# Altium footprint library SAMTEC SMD.PcbLib: 165 footprints (part 5 of 17)
Each footprint in its own frame and in the unit in brackets; x right, y up, seen from the top. Pads: shape width x height; smd on the part's side, far side on the other; paste and mask are expansions set on the pad; w line width, h text height; cw(c..) or ccw(c..) is an arc to the next point about the centre after c.
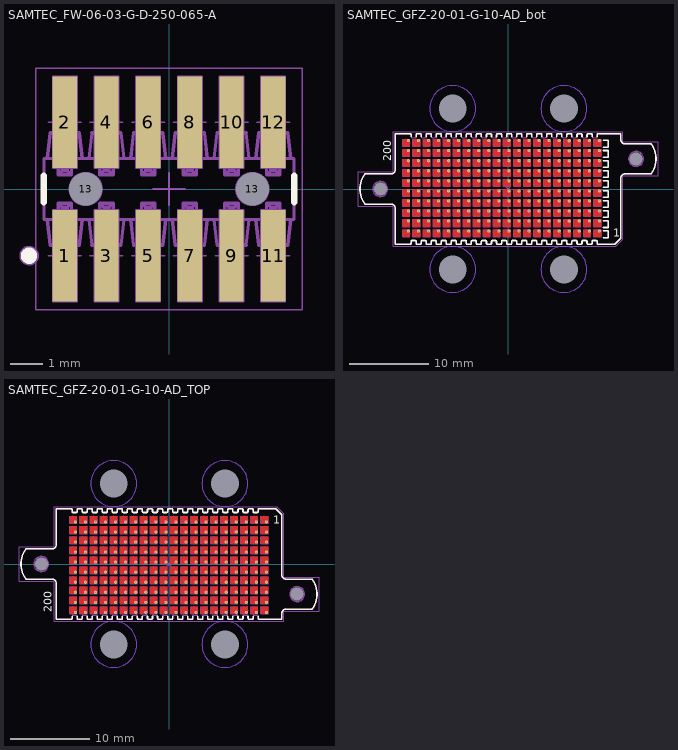
[diagram p4: the footprints below, top view; thin cyan lines are the x and y axes]

## SAMTEC_FW-06-03-G-D-250-065-A [mm] "12 Contacts, Pitch 1.27mm - SMT Micro Board Stacker"
height 8
pads (14):
  rect 0.74x2.79 smd: 1(-3.175,-2.035) 2(-3.175,2.035) 3(-1.905,-2.035) 4(-1.905,2.035) 5(-0.635,-2.035) 6(-0.635,2.035) 7(0.635,-2.035) 8(0.635,2.035) 9(1.905,-2.035) 10(1.905,2.035) 11(3.175,-2.035) 12(3.175,2.035)
  round 0.5 hole 1 unplated mask+0.25: 13(-2.54,0) 13(2.54,0)
Top Overlay:
  circle w0.25: c-4.265,-2.032 r0.125
  circle w0.25: c-4.265,-2.032 r0.125
  lines w0.2: -3.81,-0.4 -3.81,0.4 ; 3.81,-0.4 3.81,0.4
Mechanical 8:
  circle w0.05: c2.54,0 r0.5
  circle w0.05: c-2.54,0 r0.5
  lines w0.05: -3.675,-2.035 -3.175,-2.035 ; -3.675,2.035 -3.175,2.035 ; -3.175,-2.535 -3.175,-2.035 ; -3.175,-1.535 -3.175,-2.035 ; -3.175,1.535 -3.175,2.035 ; -3.175,2.535 -3.175,2.035 ; -3.04,0 -2.54,0 ; -2.675,-2.035 -3.175,-2.035 ; -2.675,2.035 -3.175,2.035 ; -2.54,-0.5 -2.54,0 ; -2.54,0.5 -2.54,0 ; -2.405,-2.035 -1.905,-2.035 ; -2.405,2.035 -1.905,2.035 ; -2.04,0 -2.54,0 ; -1.905,-2.535 -1.905,-2.035 ; -1.905,-1.535 -1.905,-2.035 ; -1.905,1.535 -1.905,2.035 ; -1.905,2.535 -1.905,2.035 ; -1.405,-2.035 -1.905,-2.035 ; -1.405,2.035 -1.905,2.035 ; -1.135,-2.035 -0.635,-2.035 ; -1.135,2.035 -0.635,2.035 ; -0.635,-2.535 -0.635,-2.035 ; -0.635,-1.535 -0.635,-2.035 ; -0.635,1.535 -0.635,2.035 ; -0.635,2.535 -0.635,2.035 ; -0.5,0 0,0 ; -0.135,-2.035 -0.635,-2.035 ; -0.135,2.035 -0.635,2.035 ; 0,-0.5 0,0 ; 0,0.5 0,0 ; 0.135,-2.035 0.635,-2.035 ; 0.135,2.035 0.635,2.035 ; 0.5,0 0,0 ; 0.635,-2.535 0.635,-2.035 ; 0.635,-1.535 0.635,-2.035 ; 0.635,1.535 0.635,2.035 ; 0.635,2.535 0.635,2.035 ; 1.135,-2.035 0.635,-2.035 ; 1.135,2.035 0.635,2.035 ; 1.405,-2.035 1.905,-2.035 ; 1.405,2.035 1.905,2.035 ; 1.905,-2.535 1.905,-2.035 ; 1.905,-1.535 1.905,-2.035 ; 1.905,1.535 1.905,2.035 ; 1.905,2.535 1.905,2.035 ; 2.04,0 2.54,0 ; 2.405,-2.035 1.905,-2.035 ; 2.405,2.035 1.905,2.035 ; 2.54,-0.5 2.54,0 ; 2.54,0.5 2.54,0 ; 2.675,-2.035 3.175,-2.035 ; 2.675,2.035 3.175,2.035 ; 3.04,0 2.54,0 ; 3.175,-2.535 3.175,-2.035 ; 3.175,-1.535 3.175,-2.035 ; 3.175,1.535 3.175,2.035 ; 3.175,2.535 3.175,2.035 ; 3.675,-2.035 3.175,-2.035 ; 3.675,2.035 3.175,2.035 ; -3.545,-3.43 -3.545,-0.64 -2.805,-0.64 -2.805,-3.43 -3.545,-3.43 ; -3.545,0.64 -2.805,0.64 -2.805,3.43 -3.545,3.43 -3.545,0.64 ; -2.275,-3.43 -2.275,-0.64 -1.535,-0.64 -1.535,-3.43 -2.275,-3.43 ; -2.275,0.64 -1.535,0.64 -1.535,3.43 -2.275,3.43 -2.275,0.64 ; -1.005,-3.43 -1.005,-0.64 -0.265,-0.64 -0.265,-3.43 -1.005,-3.43 ; -1.005,0.64 -0.265,0.64 -0.265,3.43 -1.005,3.43 -1.005,0.64 ; 0.265,-3.43 0.265,-0.64 1.005,-0.64 1.005,-3.43 0.265,-3.43 ; 0.265,0.64 1.005,0.64 1.005,3.43 0.265,3.43 0.265,0.64 ; 1.535,-3.43 1.535,-0.64 2.275,-0.64 2.275,-3.43 1.535,-3.43 ; 1.535,0.64 2.275,0.64 2.275,3.43 1.535,3.43 1.535,0.64 ; 2.805,-3.43 2.805,-0.64 3.545,-0.64 3.545,-3.43 2.805,-3.43 ; 2.805,0.64 3.545,0.64 3.545,3.43 2.805,3.43 2.805,0.64
Mechanical 14:
  drawing of 223 lines, arcs and shapes, not listed
Mechanical 15:
  lines w0.05: -4.06,-3.68 4.06,-3.68 4.06,3.68 -4.06,3.68 -4.06,-3.68
3D body "SAMTEC_FW-06-03-G-D-250-065-A.stp": height 8, standoff -0.86, extent -3.81,-2.908 3.81,2.908

## SAMTEC_GFZ-20-01-G-10-AD_bot [mm] "Z-Beam, High Speed 200 Pins, Pitch 1.27mm, Low Profile 1.65mm, Grid Array (20x10) Solderless SMT Board Stacking Connector"
height 1.65
pads (206):
  round 0.4 hole 0.2: 1(11.546,-5.318) 2(11.546,-4.048) 3(11.546,-2.778) 4(11.546,-1.508) 5(11.546,-0.238) 6(11.546,1.032) 7(11.546,2.302) 8(11.546,3.572) 9(11.546,4.842) 10(11.546,6.112) 11(10.276,-5.318) 12(10.276,-4.048) 13(10.276,-2.778) 14(10.276,-1.508) 15(10.276,-0.238) 16(10.276,1.032) 17(10.276,2.302) 18(10.276,3.572) 19(10.276,4.842) 20(10.276,6.112) 21(9.006,-5.318) 22(9.006,-4.048) 23(9.006,-2.778) 24(9.006,-1.508) 25(9.006,-0.238) 26(9.006,1.032) 27(9.006,2.302) 28(9.006,3.572) 29(9.006,4.842) 30(9.006,6.112) 31(7.736,-5.318) 32(7.736,-4.065) 33(7.736,-2.795) 34(7.736,-1.525) 35(7.736,-0.255) 36(7.736,1.015) 37(7.736,2.285) 38(7.736,3.555) 39(7.736,4.825) 40(7.736,6.095) 41(6.466,-5.318) 42(6.466,-4.048) 43(6.466,-2.778) 44(6.466,-1.508) 45(6.466,-0.238) 46(6.466,1.032) 47(6.466,2.302) 48(6.466,3.572) 49(6.466,4.842) 50(6.466,6.112) 51(5.196,-5.318) 52(5.196,-4.048) 53(5.196,-2.778) 54(5.196,-1.508) 55(5.196,-0.238) 56(5.196,1.032) 57(5.196,2.302) 58(5.196,3.572) 59(5.196,4.842) 60(5.196,6.112) 61(3.926,-5.318) 62(3.926,-4.048) 63(3.926,-2.778) 64(3.926,-1.508) 65(3.926,-0.238) 66(3.926,1.032) 67(3.926,2.302) 68(3.926,3.572) 69(3.926,4.842) 70(3.926,6.112) 71(2.656,-5.318) 72(2.656,-4.048) 73(2.656,-2.778) 74(2.656,-1.508) 75(2.656,-0.238) 76(2.656,1.032) 77(2.656,2.302) 78(2.656,3.572) 79(2.656,4.842) 80(2.656,6.112) 81(1.386,-5.318) 82(1.386,-4.048) 83(1.386,-2.778) 84(1.386,-1.508) 85(1.386,-0.238) 86(1.386,1.032) 87(1.386,2.302) 88(1.386,3.572) 89(1.386,4.842) 90(1.386,6.112) 91(0.116,-5.318) 92(0.116,-4.048) 93(0.116,-2.778) 94(0.116,-1.508) 95(0.116,-0.238) 96(0.116,1.032) 97(0.116,2.302) 98(0.116,3.572) 99(0.116,4.842) 100(0.116,6.112) 101(-1.154,-5.318) 102(-1.154,-4.048) 103(-1.154,-2.778) 104(-1.154,-1.508) 105(-1.154,-0.238) 106(-1.154,1.032) 107(-1.154,2.302) 108(-1.154,3.572) 109(-1.154,4.842) 110(-1.154,6.112) 111(-2.424,-5.318) 112(-2.424,-4.048) 113(-2.424,-2.778) 114(-2.424,-1.508) 115(-2.424,-0.238) 116(-2.424,1.032) 117(-2.424,2.302) 118(-2.424,3.572) 119(-2.424,4.842) 120(-2.424,6.112) 121(-3.694,-5.318) 122(-3.694,-4.048) 123(-3.694,-2.778) 124(-3.694,-1.508) 125(-3.694,-0.238) 126(-3.694,1.032) 127(-3.694,2.302) 128(-3.694,3.572) 129(-3.694,4.842) 130(-3.694,6.112) 131(-4.964,-5.318) 132(-4.964,-4.048) 133(-4.964,-2.778) 134(-4.964,-1.508) 135(-4.964,-0.238) 136(-4.964,1.032) 137(-4.964,2.302) 138(-4.964,3.572) 139(-4.964,4.842) 140(-4.964,6.112) 141(-6.234,-5.318) 142(-6.234,-4.048) 143(-6.234,-2.778) 144(-6.234,-1.508) 145(-6.234,-0.238) 146(-6.234,1.032) 147(-6.234,2.302) 148(-6.234,3.572) 149(-6.234,4.842) 150(-6.234,6.112) 151(-7.504,-5.318) 152(-7.504,-4.048) 153(-7.504,-2.778) 154(-7.504,-1.508) 155(-7.504,-0.238) 156(-7.504,1.032) 157(-7.504,2.302) 158(-7.504,3.572) 159(-7.504,4.842) 160(-7.504,6.112) 161(-8.774,-5.318) 162(-8.774,-4.048) 163(-8.774,-2.778) 164(-8.774,-1.508) 165(-8.774,-0.238) 166(-8.774,1.032) 167(-8.774,2.302) 168(-8.774,3.572) 169(-8.774,4.842) 170(-8.774,6.112) 171(-10.044,-5.318) 172(-10.044,-4.048) 173(-10.044,-2.778) 174(-10.044,-1.508) 175(-10.044,-0.238) 176(-10.044,1.032) 177(-10.044,2.302) 178(-10.044,3.572) 179(-10.044,4.842) 180(-10.044,6.112) 181(-11.314,-5.318) 182(-11.314,-4.048) 183(-11.314,-2.778) 184(-11.314,-1.508) 185(-11.314,-0.238) 186(-11.314,1.032) 187(-11.314,2.302) 188(-11.314,3.572) 189(-11.314,4.842) 190(-11.314,6.112) 191(-12.584,-5.318) 192(-12.584,-4.048) 193(-12.584,-2.778) 194(-12.584,-1.508) 195(-12.584,-0.238) 196(-12.584,1.032) 197(-12.584,2.302) 198(-12.584,3.572) 199(-12.584,4.842) 200(-12.584,6.112)
  round 0.5 hole 1.65 unplated mask+0.575: MEC1(-16.129,0) MEC2(16.181,3.81)
  round 0.5 hole 3.5 unplated mask+1.5: MEC3(-6.989,10.16) MEC4(7.061,10.16) MEC5(-6.989,-10.16) MEC6(7.061,-10.16)
Top Layer:
  region: -13.274,-5.118 -12.384,-5.118 -12.384,-6.008 -13.274,-6.008
  region: -12.004,-5.118 -11.114,-5.118 -11.114,-6.008 -12.004,-6.008
  region: -10.734,-5.118 -9.844,-5.118 -9.844,-6.008 -10.734,-6.008
  region: -9.464,-5.118 -8.574,-5.118 -8.574,-6.008 -9.464,-6.008
  region: -8.194,-5.118 -7.304,-5.118 -7.304,-6.008 -8.194,-6.008
  region: -6.924,-5.118 -6.034,-5.118 -6.034,-6.008 -6.924,-6.008
  region: -5.654,-5.118 -4.764,-5.118 -4.764,-6.008 -5.654,-6.008
  region: -4.384,-5.118 -3.494,-5.118 -3.494,-6.008 -4.384,-6.008
  region: -3.114,-5.118 -2.224,-5.118 -2.224,-6.008 -3.114,-6.008
  region: -1.844,-5.118 -0.954,-5.118 -0.954,-6.008 -1.844,-6.008
  region: -0.574,-5.118 0.316,-5.118 0.316,-6.008 -0.574,-6.008
  region: 0.696,-5.118 1.586,-5.118 1.586,-6.008 0.696,-6.008
  region: 1.966,-5.118 2.856,-5.118 2.856,-6.008 1.966,-6.008
  region: 3.236,-5.118 4.126,-5.118 4.126,-6.008 3.236,-6.008
  region: 4.506,-5.118 5.396,-5.118 5.396,-6.008 4.506,-6.008
  region: 5.776,-5.118 6.666,-5.118 6.666,-6.008 5.776,-6.008
  region: 7.046,-5.118 7.936,-5.118 7.936,-6.008 7.046,-6.008
  region: 8.316,-5.118 9.206,-5.118 9.206,-6.008 8.316,-6.008
  region: 9.586,-5.118 10.476,-5.118 10.476,-6.008 9.586,-6.008
  region: -13.274,-3.848 -12.384,-3.848 -12.384,-4.738 -13.274,-4.738
  region: -12.004,-3.848 -11.114,-3.848 -11.114,-4.738 -12.004,-4.738
  region: -10.734,-3.848 -9.844,-3.848 -9.844,-4.738 -10.734,-4.738
  region: -9.464,-3.848 -8.574,-3.848 -8.574,-4.738 -9.464,-4.738
  region: -8.194,-3.848 -7.304,-3.848 -7.304,-4.738 -8.194,-4.738
  region: -6.924,-3.848 -6.034,-3.848 -6.034,-4.738 -6.924,-4.738
  region: -5.654,-3.848 -4.764,-3.848 -4.764,-4.738 -5.654,-4.738
  region: -4.384,-3.848 -3.494,-3.848 -3.494,-4.738 -4.384,-4.738
  region: -3.114,-3.848 -2.224,-3.848 -2.224,-4.738 -3.114,-4.738
  region: -1.844,-3.848 -0.954,-3.848 -0.954,-4.738 -1.844,-4.738
  region: -0.574,-3.848 0.316,-3.848 0.316,-4.738 -0.574,-4.738
  region: 0.696,-3.848 1.586,-3.848 1.586,-4.738 0.696,-4.738
  region: 1.966,-3.848 2.856,-3.848 2.856,-4.738 1.966,-4.738
  region: 3.236,-3.848 4.126,-3.848 4.126,-4.738 3.236,-4.738
  region: 4.506,-3.848 5.396,-3.848 5.396,-4.738 4.506,-4.738
  region: 5.776,-3.848 6.666,-3.848 6.666,-4.738 5.776,-4.738
  region: 7.046,-3.848 7.936,-3.848 7.936,-4.738 7.046,-4.738
  region: 8.316,-3.848 9.206,-3.848 9.206,-4.738 8.316,-4.738
  region: 9.586,-3.848 10.476,-3.848 10.476,-4.738 9.586,-4.738
  region: 10.856,-3.848 11.746,-3.848 11.746,-4.738 10.856,-4.738
  region: -13.274,-2.578 -12.384,-2.578 -12.384,-3.468 -13.274,-3.468
  region: -12.004,-2.578 -11.114,-2.578 -11.114,-3.468 -12.004,-3.468
  region: -10.734,-2.578 -9.844,-2.578 -9.844,-3.468 -10.734,-3.468
  region: -9.464,-2.578 -8.574,-2.578 -8.574,-3.468 -9.464,-3.468
  region: -8.194,-2.578 -7.304,-2.578 -7.304,-3.468 -8.194,-3.468
  region: -6.924,-2.578 -6.034,-2.578 -6.034,-3.468 -6.924,-3.468
  region: -5.654,-2.578 -4.764,-2.578 -4.764,-3.468 -5.654,-3.468
  region: -4.384,-2.578 -3.494,-2.578 -3.494,-3.468 -4.384,-3.468
  region: -3.114,-2.578 -2.224,-2.578 -2.224,-3.468 -3.114,-3.468
  region: -1.844,-2.578 -0.954,-2.578 -0.954,-3.468 -1.844,-3.468
  region: -0.574,-2.578 0.316,-2.578 0.316,-3.468 -0.574,-3.468
  region: 0.696,-2.578 1.586,-2.578 1.586,-3.468 0.696,-3.468
  region: 1.966,-2.578 2.856,-2.578 2.856,-3.468 1.966,-3.468
  region: 3.236,-2.578 4.126,-2.578 4.126,-3.468 3.236,-3.468
  region: 4.506,-2.578 5.396,-2.578 5.396,-3.468 4.506,-3.468
  region: 5.776,-2.578 6.666,-2.578 6.666,-3.468 5.776,-3.468
  region: 7.046,-2.578 7.936,-2.578 7.936,-3.468 7.046,-3.468
  region: 8.316,-2.578 9.206,-2.578 9.206,-3.468 8.316,-3.468
  region: 9.586,-2.578 10.476,-2.578 10.476,-3.468 9.586,-3.468
  region: 10.856,-2.578 11.746,-2.578 11.746,-3.468 10.856,-3.468
  region: -13.274,-1.308 -12.384,-1.308 -12.384,-2.198 -13.274,-2.198
  region: -12.004,-1.308 -11.114,-1.308 -11.114,-2.198 -12.004,-2.198
  region: -10.734,-1.308 -9.844,-1.308 -9.844,-2.198 -10.734,-2.198
  region: -9.464,-1.308 -8.574,-1.308 -8.574,-2.198 -9.464,-2.198
  region: -8.194,-1.308 -7.304,-1.308 -7.304,-2.198 -8.194,-2.198
  region: -6.924,-1.308 -6.034,-1.308 -6.034,-2.198 -6.924,-2.198
  region: -5.654,-1.308 -4.764,-1.308 -4.764,-2.198 -5.654,-2.198
  region: -4.384,-1.308 -3.494,-1.308 -3.494,-2.198 -4.384,-2.198
  region: -3.114,-1.308 -2.224,-1.308 -2.224,-2.198 -3.114,-2.198
  region: -1.844,-1.308 -0.954,-1.308 -0.954,-2.198 -1.844,-2.198
  region: -0.574,-1.308 0.316,-1.308 0.316,-2.198 -0.574,-2.198
  region: 0.696,-1.308 1.586,-1.308 1.586,-2.198 0.696,-2.198
  region: 1.966,-1.308 2.856,-1.308 2.856,-2.198 1.966,-2.198
  region: 3.236,-1.308 4.126,-1.308 4.126,-2.198 3.236,-2.198
  region: 4.506,-1.308 5.396,-1.308 5.396,-2.198 4.506,-2.198
  region: 5.776,-1.308 6.666,-1.308 6.666,-2.198 5.776,-2.198
  region: 7.046,-1.308 7.936,-1.308 7.936,-2.198 7.046,-2.198
  region: 8.316,-1.308 9.206,-1.308 9.206,-2.198 8.316,-2.198
  region: 9.586,-1.308 10.476,-1.308 10.476,-2.198 9.586,-2.198
  region: 10.856,-1.308 11.746,-1.308 11.746,-2.198 10.856,-2.198
  region: -13.274,-0.038 -12.384,-0.038 -12.384,-0.928 -13.274,-0.928
  region: -12.004,-0.038 -11.114,-0.038 -11.114,-0.928 -12.004,-0.928
  region: -10.734,-0.038 -9.844,-0.038 -9.844,-0.928 -10.734,-0.928
  region: -9.464,-0.038 -8.574,-0.038 -8.574,-0.928 -9.464,-0.928
  region: -8.194,-0.038 -7.304,-0.038 -7.304,-0.928 -8.194,-0.928
  region: -6.924,-0.038 -6.034,-0.038 -6.034,-0.928 -6.924,-0.928
  region: -5.654,-0.038 -4.764,-0.038 -4.764,-0.928 -5.654,-0.928
  region: -4.384,-0.038 -3.494,-0.038 -3.494,-0.928 -4.384,-0.928
  region: -3.114,-0.038 -2.224,-0.038 -2.224,-0.928 -3.114,-0.928
  region: -1.844,-0.038 -0.954,-0.038 -0.954,-0.928 -1.844,-0.928
  region: -0.574,-0.038 0.316,-0.038 0.316,-0.928 -0.574,-0.928
  region: 0.696,-0.038 1.586,-0.038 1.586,-0.928 0.696,-0.928
  region: 1.966,-0.038 2.856,-0.038 2.856,-0.928 1.966,-0.928
  region: 3.236,-0.038 4.126,-0.038 4.126,-0.928 3.236,-0.928
  region: 4.506,-0.038 5.396,-0.038 5.396,-0.928 4.506,-0.928
  region: 5.776,-0.038 6.666,-0.038 6.666,-0.928 5.776,-0.928
  region: 7.046,-0.038 7.936,-0.038 7.936,-0.928 7.046,-0.928
  region: 8.316,-0.038 9.206,-0.038 9.206,-0.928 8.316,-0.928
  region: 9.586,-0.038 10.476,-0.038 10.476,-0.928 9.586,-0.928
  region: 10.856,-0.038 11.746,-0.038 11.746,-0.928 10.856,-0.928
  region: -13.274,1.232 -12.384,1.232 -12.384,0.342 -13.274,0.342
  region: -12.004,1.232 -11.114,1.232 -11.114,0.342 -12.004,0.342
  region: -10.734,1.232 -9.844,1.232 -9.844,0.342 -10.734,0.342
  region: -9.464,1.232 -8.574,1.232 -8.574,0.342 -9.464,0.342
  region: -8.194,1.232 -7.304,1.232 -7.304,0.342 -8.194,0.342
  region: -6.924,1.232 -6.034,1.232 -6.034,0.342 -6.924,0.342
  region: -5.654,1.232 -4.764,1.232 -4.764,0.342 -5.654,0.342
  region: -4.384,1.232 -3.494,1.232 -3.494,0.342 -4.384,0.342
  region: -3.114,1.232 -2.224,1.232 -2.224,0.342 -3.114,0.342
  region: -1.844,1.232 -0.954,1.232 -0.954,0.342 -1.844,0.342
  region: -0.574,1.232 0.316,1.232 0.316,0.342 -0.574,0.342
  region: 0.696,1.232 1.586,1.232 1.586,0.342 0.696,0.342
  region: 1.966,1.232 2.856,1.232 2.856,0.342 1.966,0.342
  region: 3.236,1.232 4.126,1.232 4.126,0.342 3.236,0.342
  region: 4.506,1.232 5.396,1.232 5.396,0.342 4.506,0.342
  region: 5.776,1.232 6.666,1.232 6.666,0.342 5.776,0.342
  region: 7.046,1.232 7.936,1.232 7.936,0.342 7.046,0.342
  region: 8.316,1.232 9.206,1.232 9.206,0.342 8.316,0.342
  region: 9.586,1.232 10.476,1.232 10.476,0.342 9.586,0.342
  region: 10.856,1.232 11.746,1.232 11.746,0.342 10.856,0.342
  region: -13.274,2.502 -12.384,2.502 -12.384,1.612 -13.274,1.612
  region: -12.004,2.502 -11.114,2.502 -11.114,1.612 -12.004,1.612
  region: -10.734,2.502 -9.844,2.502 -9.844,1.612 -10.734,1.612
  region: -9.464,2.502 -8.574,2.502 -8.574,1.612 -9.464,1.612
  region: -8.194,2.502 -7.304,2.502 -7.304,1.612 -8.194,1.612
  region: -6.924,2.502 -6.034,2.502 -6.034,1.612 -6.924,1.612
  region: -5.654,2.502 -4.764,2.502 -4.764,1.612 -5.654,1.612
  region: -4.384,2.502 -3.494,2.502 -3.494,1.612 -4.384,1.612
  region: -3.114,2.502 -2.224,2.502 -2.224,1.612 -3.114,1.612
  region: -1.844,2.502 -0.954,2.502 -0.954,1.612 -1.844,1.612
  region: -0.574,2.502 0.316,2.502 0.316,1.612 -0.574,1.612
  region: 0.696,2.502 1.586,2.502 1.586,1.612 0.696,1.612
  region: 1.966,2.502 2.856,2.502 2.856,1.612 1.966,1.612
  region: 3.236,2.502 4.126,2.502 4.126,1.612 3.236,1.612
  region: 4.506,2.502 5.396,2.502 5.396,1.612 4.506,1.612
  region: 5.776,2.502 6.666,2.502 6.666,1.612 5.776,1.612
  region: 7.046,2.502 7.936,2.502 7.936,1.612 7.046,1.612
  region: 8.316,2.502 9.206,2.502 9.206,1.612 8.316,1.612
  region: 9.586,2.502 10.476,2.502 10.476,1.612 9.586,1.612
  region: 10.856,2.502 11.746,2.502 11.746,1.612 10.856,1.612
  region: -13.274,3.772 -12.384,3.772 -12.384,2.882 -13.274,2.882
  region: -12.004,3.772 -11.114,3.772 -11.114,2.882 -12.004,2.882
  region: -10.734,3.772 -9.844,3.772 -9.844,2.882 -10.734,2.882
  region: -9.464,3.772 -8.574,3.772 -8.574,2.882 -9.464,2.882
  region: -8.194,3.772 -7.304,3.772 -7.304,2.882 -8.194,2.882
  region: -6.924,3.772 -6.034,3.772 -6.034,2.882 -6.924,2.882
  region: -5.654,3.772 -4.764,3.772 -4.764,2.882 -5.654,2.882
  region: -4.384,3.772 -3.494,3.772 -3.494,2.882 -4.384,2.882
  region: -3.114,3.772 -2.224,3.772 -2.224,2.882 -3.114,2.882
  region: -1.844,3.772 -0.954,3.772 -0.954,2.882 -1.844,2.882
  region: -0.574,3.772 0.316,3.772 0.316,2.882 -0.574,2.882
  region: 0.696,3.772 1.586,3.772 1.586,2.882 0.696,2.882
  region: 1.966,3.772 2.856,3.772 2.856,2.882 1.966,2.882
  region: 3.236,3.772 4.126,3.772 4.126,2.882 3.236,2.882
  region: 4.506,3.772 5.396,3.772 5.396,2.882 4.506,2.882
  region: 5.776,3.772 6.666,3.772 6.666,2.882 5.776,2.882
  region: 7.046,3.772 7.936,3.772 7.936,2.882 7.046,2.882
  region: 8.316,3.772 9.206,3.772 9.206,2.882 8.316,2.882
  region: 9.586,3.772 10.476,3.772 10.476,2.882 9.586,2.882
  region: 10.856,3.772 11.746,3.772 11.746,2.882 10.856,2.882
  region: -13.274,5.042 -12.384,5.042 -12.384,4.152 -13.274,4.152
  region: -12.004,5.042 -11.114,5.042 -11.114,4.152 -12.004,4.152
  region: -10.734,5.042 -9.844,5.042 -9.844,4.152 -10.734,4.152
  region: -9.464,5.042 -8.574,5.042 -8.574,4.152 -9.464,4.152
  region: -8.194,5.042 -7.304,5.042 -7.304,4.152 -8.194,4.152
  region: -6.924,5.042 -6.034,5.042 -6.034,4.152 -6.924,4.152
  region: -5.654,5.042 -4.764,5.042 -4.764,4.152 -5.654,4.152
  region: -4.384,5.042 -3.494,5.042 -3.494,4.152 -4.384,4.152
  region: -3.114,5.042 -2.224,5.042 -2.224,4.152 -3.114,4.152
  region: -1.844,5.042 -0.954,5.042 -0.954,4.152 -1.844,4.152
  region: -0.574,5.042 0.316,5.042 0.316,4.152 -0.574,4.152
  region: 0.696,5.042 1.586,5.042 1.586,4.152 0.696,4.152
  region: 1.966,5.042 2.856,5.042 2.856,4.152 1.966,4.152
  region: 3.236,5.042 4.126,5.042 4.126,4.152 3.236,4.152
  region: 4.506,5.042 5.396,5.042 5.396,4.152 4.506,4.152
  region: 5.776,5.042 6.666,5.042 6.666,4.152 5.776,4.152
  region: 7.046,5.042 7.936,5.042 7.936,4.152 7.046,4.152
  region: 8.316,5.042 9.206,5.042 9.206,4.152 8.316,4.152
  region: 9.586,5.042 10.476,5.042 10.476,4.152 9.586,4.152
  region: 10.856,5.042 11.746,5.042 11.746,4.152 10.856,4.152
  region: -13.274,6.312 -12.384,6.312 -12.384,5.422 -13.274,5.422
  region: -12.004,6.312 -11.114,6.312 -11.114,5.422 -12.004,5.422
  region: -10.734,6.312 -9.844,6.312 -9.844,5.422 -10.734,5.422
  region: -9.464,6.312 -8.574,6.312 -8.574,5.422 -9.464,5.422
  region: -8.194,6.312 -7.304,6.312 -7.304,5.422 -8.194,5.422
  region: -6.924,6.312 -6.034,6.312 -6.034,5.422 -6.924,5.422
  region: -5.654,6.312 -4.764,6.312 -4.764,5.422 -5.654,5.422
  region: -4.384,6.312 -3.494,6.312 -3.494,5.422 -4.384,5.422
  region: -3.114,6.312 -2.224,6.312 -2.224,5.422 -3.114,5.422
  region: -1.844,6.312 -0.954,6.312 -0.954,5.422 -1.844,5.422
  region: -0.574,6.312 0.316,6.312 0.316,5.422 -0.574,5.422
  region: 0.696,6.312 1.586,6.312 1.586,5.422 0.696,5.422
  region: 1.966,6.312 2.856,6.312 2.856,5.422 1.966,5.422
  region: 3.236,6.312 4.126,6.312 4.126,5.422 3.236,5.422
  region: 4.506,6.312 5.396,6.312 5.396,5.422 4.506,5.422
  region: 5.776,6.312 6.666,6.312 6.666,5.422 5.776,5.422
  region: 7.046,6.312 7.936,6.312 7.936,5.422 7.046,5.422
  region: 8.316,6.312 9.206,6.312 9.206,5.422 8.316,5.422
  region: 9.586,6.312 10.476,6.312 10.476,5.422 9.586,5.422
  region: 10.856,6.312 11.746,6.312 11.746,5.422 10.856,5.422
  region: 10.856,-5.118 11.746,-5.118 11.746,-6.008 10.856,-6.008
Bottom Layer keep-out:
  circle w0.1: c7.061,10.16 r2.9
  circle w0.1: c-6.989,10.16 r2.9
  circle w0.1: c7.061,-10.16 r2.9
  circle w0.1: c-6.989,-10.16 r2.9
Top Overlay:
  drawing of 298 lines, arcs and shapes, not listed
  text "200" at -14.771,3.515 h1
  text "1" at 13.285,-6.049 h1
Mechanical 8:
  drawing of 1722 lines, arcs and shapes, not listed
Mechanical 14:
  drawing of 357 lines, arcs and shapes, not listed
  text "200" at -14.771,3.515 h1
  text "1" at 13.285,-6.049 h1
Mechanical 15:
  lines w0.05: -18.944,-2.155 -18.944,2.155 -14.499,2.155 -14.499,7.235 14.499,7.235 14.499,5.965 18.944,5.965 18.944,1.655 14.499,1.655 14.499,-6.327 13.591,-7.235 -14.499,-7.235 -14.499,-2.155 -18.944,-2.155
3D body "SAMTEC_GFZ-20-01-G-10-AD_BOT.stp": height 2.92, standoff -1.27, extent -18.687,-6.985 18.687,6.985

## SAMTEC_GFZ-20-01-G-10-AD_TOP [mm] "Z-Beam, High Speed 200 Pins, Pitch 1.27mm, Low Profile 1.65mm, Grid Array (20x10) Solderless SMT Board Stacking Connector"
height 1.65
pads (206):
  round 0.4 hole 0.2: 1(12.306,5.318) 2(12.306,4.048) 3(12.306,2.778) 4(12.306,1.508) 5(12.306,0.238) 6(12.306,-1.032) 7(12.306,-2.302) 8(12.306,-3.572) 9(12.306,-4.842) 10(12.306,-6.112) 11(11.036,5.318) 12(11.036,4.048) 13(11.036,2.778) 14(11.036,1.508) 15(11.036,0.238) 16(11.036,-1.032) 17(11.036,-2.302) 18(11.036,-3.572) 19(11.036,-4.842) 20(11.036,-6.112) 21(9.766,5.318) 22(9.766,4.048) 23(9.766,2.778) 24(9.766,1.508) 25(9.766,0.238) 26(9.766,-1.032) 27(9.766,-2.302) 28(9.766,-3.572) 29(9.766,-4.842) 30(9.766,-6.112) 31(8.496,5.318) 32(8.496,4.065) 33(8.496,2.795) 34(8.496,1.525) 35(8.496,0.255) 36(8.496,-1.015) 37(8.496,-2.285) 38(8.496,-3.555) 39(8.496,-4.825) 40(8.496,-6.095) 41(7.226,5.318) 42(7.226,4.048) 43(7.226,2.778) 44(7.226,1.508) 45(7.226,0.238) 46(7.226,-1.032) 47(7.226,-2.302) 48(7.226,-3.572) 49(7.226,-4.842) 50(7.226,-6.112) 51(5.956,5.318) 52(5.956,4.048) 53(5.956,2.778) 54(5.956,1.508) 55(5.956,0.238) 56(5.956,-1.032) 57(5.956,-2.302) 58(5.956,-3.572) 59(5.956,-4.842) 60(5.956,-6.112) 61(4.686,5.318) 62(4.686,4.048) 63(4.686,2.778) 64(4.686,1.508) 65(4.686,0.238) 66(4.686,-1.032) 67(4.686,-2.302) 68(4.686,-3.572) 69(4.686,-4.842) 70(4.686,-6.112) 71(3.416,5.318) 72(3.416,4.048) 73(3.416,2.778) 74(3.416,1.508) 75(3.416,0.238) 76(3.416,-1.032) 77(3.416,-2.302) 78(3.416,-3.572) 79(3.416,-4.842) 80(3.416,-6.112) 81(2.146,5.318) 82(2.146,4.048) 83(2.146,2.778) 84(2.146,1.508) 85(2.146,0.238) 86(2.146,-1.032) 87(2.146,-2.302) 88(2.146,-3.572) 89(2.146,-4.842) 90(2.146,-6.112) 91(0.876,5.318) 92(0.876,4.048) 93(0.876,2.778) 94(0.876,1.508) 95(0.876,0.238) 96(0.876,-1.032) 97(0.876,-2.302) 98(0.876,-3.572) 99(0.876,-4.842) 100(0.876,-6.112) 101(-0.394,5.318) 102(-0.394,4.048) 103(-0.394,2.778) 104(-0.394,1.508) 105(-0.394,0.238) 106(-0.394,-1.032) 107(-0.394,-2.302) 108(-0.394,-3.572) 109(-0.394,-4.842) 110(-0.394,-6.112) 111(-1.664,5.318) 112(-1.664,4.048) 113(-1.664,2.778) 114(-1.664,1.508) 115(-1.664,0.238) 116(-1.664,-1.032) 117(-1.664,-2.302) 118(-1.664,-3.572) 119(-1.664,-4.842) 120(-1.664,-6.112) 121(-2.934,5.318) 122(-2.934,4.048) 123(-2.934,2.778) 124(-2.934,1.508) 125(-2.934,0.238) 126(-2.934,-1.032) 127(-2.934,-2.302) 128(-2.934,-3.572) 129(-2.934,-4.842) 130(-2.934,-6.112) 131(-4.204,5.318) 132(-4.204,4.048) 133(-4.204,2.778) 134(-4.204,1.508) 135(-4.204,0.238) 136(-4.204,-1.032) 137(-4.204,-2.302) 138(-4.204,-3.572) 139(-4.204,-4.842) 140(-4.204,-6.112) 141(-5.474,5.318) 142(-5.474,4.048) 143(-5.474,2.778) 144(-5.474,1.508) 145(-5.474,0.238) 146(-5.474,-1.032) 147(-5.474,-2.302) 148(-5.474,-3.572) 149(-5.474,-4.842) 150(-5.474,-6.112) 151(-6.744,5.318) 152(-6.744,4.048) 153(-6.744,2.778) 154(-6.744,1.508) 155(-6.744,0.238) 156(-6.744,-1.032) 157(-6.744,-2.302) 158(-6.744,-3.572) 159(-6.744,-4.842) 160(-6.744,-6.112) 161(-8.014,5.318) 162(-8.014,4.048) 163(-8.014,2.778) 164(-8.014,1.508) 165(-8.014,0.238) 166(-8.014,-1.032) 167(-8.014,-2.302) 168(-8.014,-3.572) 169(-8.014,-4.842) 170(-8.014,-6.112) 171(-9.284,5.318) 172(-9.284,4.048) 173(-9.284,2.778) 174(-9.284,1.508) 175(-9.284,0.238) 176(-9.284,-1.032) 177(-9.284,-2.302) 178(-9.284,-3.572) 179(-9.284,-4.842) 180(-9.284,-6.112) 181(-10.554,5.318) 182(-10.554,4.048) 183(-10.554,2.778) 184(-10.554,1.508) 185(-10.554,0.238) 186(-10.554,-1.032) 187(-10.554,-2.302) 188(-10.554,-3.572) 189(-10.554,-4.842) 190(-10.554,-6.112) 191(-11.824,5.318) 192(-11.824,4.048) 193(-11.824,2.778) 194(-11.824,1.508) 195(-11.824,0.238) 196(-11.824,-1.032) 197(-11.824,-2.302) 198(-11.824,-3.572) 199(-11.824,-4.842) 200(-11.824,-6.112)
  round 0.5 hole 1.65 unplated mask+0.575: MEC1(-16.129,0) MEC2(16.181,-3.81)
  round 0.5 hole 3.5 unplated mask+1.5: MEC3(-6.989,10.16) MEC4(7.061,10.16) MEC5(-6.989,-10.16) MEC6(7.061,-10.16)
Top Layer:
  region: -12.514,-5.422 -11.624,-5.422 -11.624,-6.312 -12.514,-6.312
  region: -11.244,-5.422 -10.354,-5.422 -10.354,-6.312 -11.244,-6.312
  region: -9.974,-5.422 -9.084,-5.422 -9.084,-6.312 -9.974,-6.312
  region: -8.704,-5.422 -7.814,-5.422 -7.814,-6.312 -8.704,-6.312
  region: -7.434,-5.422 -6.544,-5.422 -6.544,-6.312 -7.434,-6.312
  region: -6.164,-5.422 -5.274,-5.422 -5.274,-6.312 -6.164,-6.312
  region: -4.894,-5.422 -4.004,-5.422 -4.004,-6.312 -4.894,-6.312
  region: -3.624,-5.422 -2.734,-5.422 -2.734,-6.312 -3.624,-6.312
  region: -2.354,-5.422 -1.464,-5.422 -1.464,-6.312 -2.354,-6.312
  region: -1.084,-5.422 -0.194,-5.422 -0.194,-6.312 -1.084,-6.312
  region: 0.186,-5.422 1.076,-5.422 1.076,-6.312 0.186,-6.312
  region: 1.456,-5.422 2.346,-5.422 2.346,-6.312 1.456,-6.312
  region: 2.726,-5.422 3.616,-5.422 3.616,-6.312 2.726,-6.312
  region: 3.996,-5.422 4.886,-5.422 4.886,-6.312 3.996,-6.312
  region: 5.266,-5.422 6.156,-5.422 6.156,-6.312 5.266,-6.312
  region: 6.536,-5.422 7.426,-5.422 7.426,-6.312 6.536,-6.312
  region: 7.806,-5.422 8.696,-5.422 8.696,-6.312 7.806,-6.312
  region: 9.076,-5.422 9.966,-5.422 9.966,-6.312 9.076,-6.312
  region: 10.346,-5.422 11.236,-5.422 11.236,-6.312 10.346,-6.312
  region: -12.514,-4.152 -11.624,-4.152 -11.624,-5.042 -12.514,-5.042
  region: -11.244,-4.152 -10.354,-4.152 -10.354,-5.042 -11.244,-5.042
  region: -9.974,-4.152 -9.084,-4.152 -9.084,-5.042 -9.974,-5.042
  region: -8.704,-4.152 -7.814,-4.152 -7.814,-5.042 -8.704,-5.042
  region: -7.434,-4.152 -6.544,-4.152 -6.544,-5.042 -7.434,-5.042
  region: -6.164,-4.152 -5.274,-4.152 -5.274,-5.042 -6.164,-5.042
  region: -4.894,-4.152 -4.004,-4.152 -4.004,-5.042 -4.894,-5.042
  region: -3.624,-4.152 -2.734,-4.152 -2.734,-5.042 -3.624,-5.042
  region: -2.354,-4.152 -1.464,-4.152 -1.464,-5.042 -2.354,-5.042
  region: -1.084,-4.152 -0.194,-4.152 -0.194,-5.042 -1.084,-5.042
  region: 0.186,-4.152 1.076,-4.152 1.076,-5.042 0.186,-5.042
  region: 1.456,-4.152 2.346,-4.152 2.346,-5.042 1.456,-5.042
  region: 2.726,-4.152 3.616,-4.152 3.616,-5.042 2.726,-5.042
  region: 3.996,-4.152 4.886,-4.152 4.886,-5.042 3.996,-5.042
  region: 5.266,-4.152 6.156,-4.152 6.156,-5.042 5.266,-5.042
  region: 6.536,-4.152 7.426,-4.152 7.426,-5.042 6.536,-5.042
  region: 7.806,-4.152 8.696,-4.152 8.696,-5.042 7.806,-5.042
  region: 9.076,-4.152 9.966,-4.152 9.966,-5.042 9.076,-5.042
  region: 10.346,-4.152 11.236,-4.152 11.236,-5.042 10.346,-5.042
  region: 11.616,-4.152 12.506,-4.152 12.506,-5.042 11.616,-5.042
  region: -12.514,-2.882 -11.624,-2.882 -11.624,-3.772 -12.514,-3.772
  region: -11.244,-2.882 -10.354,-2.882 -10.354,-3.772 -11.244,-3.772
  region: -9.974,-2.882 -9.084,-2.882 -9.084,-3.772 -9.974,-3.772
  region: -8.704,-2.882 -7.814,-2.882 -7.814,-3.772 -8.704,-3.772
  region: -7.434,-2.882 -6.544,-2.882 -6.544,-3.772 -7.434,-3.772
  region: -6.164,-2.882 -5.274,-2.882 -5.274,-3.772 -6.164,-3.772
  region: -4.894,-2.882 -4.004,-2.882 -4.004,-3.772 -4.894,-3.772
  region: -3.624,-2.882 -2.734,-2.882 -2.734,-3.772 -3.624,-3.772
  region: -2.354,-2.882 -1.464,-2.882 -1.464,-3.772 -2.354,-3.772
  region: -1.084,-2.882 -0.194,-2.882 -0.194,-3.772 -1.084,-3.772
  region: 0.186,-2.882 1.076,-2.882 1.076,-3.772 0.186,-3.772
  region: 1.456,-2.882 2.346,-2.882 2.346,-3.772 1.456,-3.772
  region: 2.726,-2.882 3.616,-2.882 3.616,-3.772 2.726,-3.772
  region: 3.996,-2.882 4.886,-2.882 4.886,-3.772 3.996,-3.772
  region: 5.266,-2.882 6.156,-2.882 6.156,-3.772 5.266,-3.772
  region: 6.536,-2.882 7.426,-2.882 7.426,-3.772 6.536,-3.772
  region: 7.806,-2.882 8.696,-2.882 8.696,-3.772 7.806,-3.772
  region: 9.076,-2.882 9.966,-2.882 9.966,-3.772 9.076,-3.772
  region: 10.346,-2.882 11.236,-2.882 11.236,-3.772 10.346,-3.772
  region: 11.616,-2.882 12.506,-2.882 12.506,-3.772 11.616,-3.772
  region: -12.514,-1.612 -11.624,-1.612 -11.624,-2.502 -12.514,-2.502
  region: -11.244,-1.612 -10.354,-1.612 -10.354,-2.502 -11.244,-2.502
  region: -9.974,-1.612 -9.084,-1.612 -9.084,-2.502 -9.974,-2.502
  region: -8.704,-1.612 -7.814,-1.612 -7.814,-2.502 -8.704,-2.502
  region: -7.434,-1.612 -6.544,-1.612 -6.544,-2.502 -7.434,-2.502
  region: -6.164,-1.612 -5.274,-1.612 -5.274,-2.502 -6.164,-2.502
  region: -4.894,-1.612 -4.004,-1.612 -4.004,-2.502 -4.894,-2.502
  region: -3.624,-1.612 -2.734,-1.612 -2.734,-2.502 -3.624,-2.502
  region: -2.354,-1.612 -1.464,-1.612 -1.464,-2.502 -2.354,-2.502
  region: -1.084,-1.612 -0.194,-1.612 -0.194,-2.502 -1.084,-2.502
  region: 0.186,-1.612 1.076,-1.612 1.076,-2.502 0.186,-2.502
  region: 1.456,-1.612 2.346,-1.612 2.346,-2.502 1.456,-2.502
  region: 2.726,-1.612 3.616,-1.612 3.616,-2.502 2.726,-2.502
  region: 3.996,-1.612 4.886,-1.612 4.886,-2.502 3.996,-2.502
  region: 5.266,-1.612 6.156,-1.612 6.156,-2.502 5.266,-2.502
  region: 6.536,-1.612 7.426,-1.612 7.426,-2.502 6.536,-2.502
  region: 7.806,-1.612 8.696,-1.612 8.696,-2.502 7.806,-2.502
  region: 9.076,-1.612 9.966,-1.612 9.966,-2.502 9.076,-2.502
  region: 10.346,-1.612 11.236,-1.612 11.236,-2.502 10.346,-2.502
  region: 11.616,-1.612 12.506,-1.612 12.506,-2.502 11.616,-2.502
  region: -12.514,-0.342 -11.624,-0.342 -11.624,-1.232 -12.514,-1.232
  region: -11.244,-0.342 -10.354,-0.342 -10.354,-1.232 -11.244,-1.232
  region: -9.974,-0.342 -9.084,-0.342 -9.084,-1.232 -9.974,-1.232
  region: -8.704,-0.342 -7.814,-0.342 -7.814,-1.232 -8.704,-1.232
  region: -7.434,-0.342 -6.544,-0.342 -6.544,-1.232 -7.434,-1.232
  region: -6.164,-0.342 -5.274,-0.342 -5.274,-1.232 -6.164,-1.232
  region: -4.894,-0.342 -4.004,-0.342 -4.004,-1.232 -4.894,-1.232
  region: -3.624,-0.342 -2.734,-0.342 -2.734,-1.232 -3.624,-1.232
  region: -2.354,-0.342 -1.464,-0.342 -1.464,-1.232 -2.354,-1.232
  region: -1.084,-0.342 -0.194,-0.342 -0.194,-1.232 -1.084,-1.232
  region: 0.186,-0.342 1.076,-0.342 1.076,-1.232 0.186,-1.232
  region: 1.456,-0.342 2.346,-0.342 2.346,-1.232 1.456,-1.232
  region: 2.726,-0.342 3.616,-0.342 3.616,-1.232 2.726,-1.232
  region: 3.996,-0.342 4.886,-0.342 4.886,-1.232 3.996,-1.232
  region: 5.266,-0.342 6.156,-0.342 6.156,-1.232 5.266,-1.232
  region: 6.536,-0.342 7.426,-0.342 7.426,-1.232 6.536,-1.232
  region: 7.806,-0.342 8.696,-0.342 8.696,-1.232 7.806,-1.232
  region: 9.076,-0.342 9.966,-0.342 9.966,-1.232 9.076,-1.232
  region: 10.346,-0.342 11.236,-0.342 11.236,-1.232 10.346,-1.232
  region: 11.616,-0.342 12.506,-0.342 12.506,-1.232 11.616,-1.232
  region: -12.514,0.928 -11.624,0.928 -11.624,0.038 -12.514,0.038
  region: -11.244,0.928 -10.354,0.928 -10.354,0.038 -11.244,0.038
  region: -9.974,0.928 -9.084,0.928 -9.084,0.038 -9.974,0.038
  region: -8.704,0.928 -7.814,0.928 -7.814,0.038 -8.704,0.038
  region: -7.434,0.928 -6.544,0.928 -6.544,0.038 -7.434,0.038
  region: -6.164,0.928 -5.274,0.928 -5.274,0.038 -6.164,0.038
  region: -4.894,0.928 -4.004,0.928 -4.004,0.038 -4.894,0.038
  region: -3.624,0.928 -2.734,0.928 -2.734,0.038 -3.624,0.038
  region: -2.354,0.928 -1.464,0.928 -1.464,0.038 -2.354,0.038
  region: -1.084,0.928 -0.194,0.928 -0.194,0.038 -1.084,0.038
  region: 0.186,0.928 1.076,0.928 1.076,0.038 0.186,0.038
  region: 1.456,0.928 2.346,0.928 2.346,0.038 1.456,0.038
  region: 2.726,0.928 3.616,0.928 3.616,0.038 2.726,0.038
  region: 3.996,0.928 4.886,0.928 4.886,0.038 3.996,0.038
  region: 5.266,0.928 6.156,0.928 6.156,0.038 5.266,0.038
  region: 6.536,0.928 7.426,0.928 7.426,0.038 6.536,0.038
  region: 7.806,0.928 8.696,0.928 8.696,0.038 7.806,0.038
  region: 9.076,0.928 9.966,0.928 9.966,0.038 9.076,0.038
  region: 10.346,0.928 11.236,0.928 11.236,0.038 10.346,0.038
  region: 11.616,0.928 12.506,0.928 12.506,0.038 11.616,0.038
  region: -12.514,2.198 -11.624,2.198 -11.624,1.308 -12.514,1.308
  region: -11.244,2.198 -10.354,2.198 -10.354,1.308 -11.244,1.308
  region: -9.974,2.198 -9.084,2.198 -9.084,1.308 -9.974,1.308
  region: -8.704,2.198 -7.814,2.198 -7.814,1.308 -8.704,1.308
  region: -7.434,2.198 -6.544,2.198 -6.544,1.308 -7.434,1.308
  region: -6.164,2.198 -5.274,2.198 -5.274,1.308 -6.164,1.308
  region: -4.894,2.198 -4.004,2.198 -4.004,1.308 -4.894,1.308
  region: -3.624,2.198 -2.734,2.198 -2.734,1.308 -3.624,1.308
  region: -2.354,2.198 -1.464,2.198 -1.464,1.308 -2.354,1.308
  region: -1.084,2.198 -0.194,2.198 -0.194,1.308 -1.084,1.308
  region: 0.186,2.198 1.076,2.198 1.076,1.308 0.186,1.308
  region: 1.456,2.198 2.346,2.198 2.346,1.308 1.456,1.308
  region: 2.726,2.198 3.616,2.198 3.616,1.308 2.726,1.308
  region: 3.996,2.198 4.886,2.198 4.886,1.308 3.996,1.308
  region: 5.266,2.198 6.156,2.198 6.156,1.308 5.266,1.308
  region: 6.536,2.198 7.426,2.198 7.426,1.308 6.536,1.308
  region: 7.806,2.198 8.696,2.198 8.696,1.308 7.806,1.308
  region: 9.076,2.198 9.966,2.198 9.966,1.308 9.076,1.308
  region: 10.346,2.198 11.236,2.198 11.236,1.308 10.346,1.308
  region: 11.616,2.198 12.506,2.198 12.506,1.308 11.616,1.308
  region: -12.514,3.468 -11.624,3.468 -11.624,2.578 -12.514,2.578
  region: -11.244,3.468 -10.354,3.468 -10.354,2.578 -11.244,2.578
  region: -9.974,3.468 -9.084,3.468 -9.084,2.578 -9.974,2.578
  region: -8.704,3.468 -7.814,3.468 -7.814,2.578 -8.704,2.578
  region: -7.434,3.468 -6.544,3.468 -6.544,2.578 -7.434,2.578
  region: -6.164,3.468 -5.274,3.468 -5.274,2.578 -6.164,2.578
  region: -4.894,3.468 -4.004,3.468 -4.004,2.578 -4.894,2.578
  region: -3.624,3.468 -2.734,3.468 -2.734,2.578 -3.624,2.578
  region: -2.354,3.468 -1.464,3.468 -1.464,2.578 -2.354,2.578
  region: -1.084,3.468 -0.194,3.468 -0.194,2.578 -1.084,2.578
  region: 0.186,3.468 1.076,3.468 1.076,2.578 0.186,2.578
  region: 1.456,3.468 2.346,3.468 2.346,2.578 1.456,2.578
  region: 2.726,3.468 3.616,3.468 3.616,2.578 2.726,2.578
  region: 3.996,3.468 4.886,3.468 4.886,2.578 3.996,2.578
  region: 5.266,3.468 6.156,3.468 6.156,2.578 5.266,2.578
  region: 6.536,3.468 7.426,3.468 7.426,2.578 6.536,2.578
  region: 7.806,3.468 8.696,3.468 8.696,2.578 7.806,2.578
  region: 9.076,3.468 9.966,3.468 9.966,2.578 9.076,2.578
  region: 10.346,3.468 11.236,3.468 11.236,2.578 10.346,2.578
  region: 11.616,3.468 12.506,3.468 12.506,2.578 11.616,2.578
  region: -12.514,4.738 -11.624,4.738 -11.624,3.848 -12.514,3.848
  region: -11.244,4.738 -10.354,4.738 -10.354,3.848 -11.244,3.848
  region: -9.974,4.738 -9.084,4.738 -9.084,3.848 -9.974,3.848
  region: -8.704,4.738 -7.814,4.738 -7.814,3.848 -8.704,3.848
  region: -7.434,4.738 -6.544,4.738 -6.544,3.848 -7.434,3.848
  region: -6.164,4.738 -5.274,4.738 -5.274,3.848 -6.164,3.848
  region: -4.894,4.738 -4.004,4.738 -4.004,3.848 -4.894,3.848
  region: -3.624,4.738 -2.734,4.738 -2.734,3.848 -3.624,3.848
  region: -2.354,4.738 -1.464,4.738 -1.464,3.848 -2.354,3.848
  region: -1.084,4.738 -0.194,4.738 -0.194,3.848 -1.084,3.848
  region: 0.186,4.738 1.076,4.738 1.076,3.848 0.186,3.848
  region: 1.456,4.738 2.346,4.738 2.346,3.848 1.456,3.848
  region: 2.726,4.738 3.616,4.738 3.616,3.848 2.726,3.848
  region: 3.996,4.738 4.886,4.738 4.886,3.848 3.996,3.848
  region: 5.266,4.738 6.156,4.738 6.156,3.848 5.266,3.848
  region: 6.536,4.738 7.426,4.738 7.426,3.848 6.536,3.848
  region: 7.806,4.738 8.696,4.738 8.696,3.848 7.806,3.848
  region: 9.076,4.738 9.966,4.738 9.966,3.848 9.076,3.848
  region: 10.346,4.738 11.236,4.738 11.236,3.848 10.346,3.848
  region: 11.616,4.738 12.506,4.738 12.506,3.848 11.616,3.848
  region: -12.514,6.008 -11.624,6.008 -11.624,5.118 -12.514,5.118
  region: -11.244,6.008 -10.354,6.008 -10.354,5.118 -11.244,5.118
  region: -9.974,6.008 -9.084,6.008 -9.084,5.118 -9.974,5.118
  region: -8.704,6.008 -7.814,6.008 -7.814,5.118 -8.704,5.118
  region: -7.434,6.008 -6.544,6.008 -6.544,5.118 -7.434,5.118
  region: -6.164,6.008 -5.274,6.008 -5.274,5.118 -6.164,5.118
  region: -4.894,6.008 -4.004,6.008 -4.004,5.118 -4.894,5.118
  region: -3.624,6.008 -2.734,6.008 -2.734,5.118 -3.624,5.118
  region: -2.354,6.008 -1.464,6.008 -1.464,5.118 -2.354,5.118
  region: -1.084,6.008 -0.194,6.008 -0.194,5.118 -1.084,5.118
  region: 0.186,6.008 1.076,6.008 1.076,5.118 0.186,5.118
  region: 1.456,6.008 2.346,6.008 2.346,5.118 1.456,5.118
  region: 2.726,6.008 3.616,6.008 3.616,5.118 2.726,5.118
  region: 3.996,6.008 4.886,6.008 4.886,5.118 3.996,5.118
  region: 5.266,6.008 6.156,6.008 6.156,5.118 5.266,5.118
  region: 6.536,6.008 7.426,6.008 7.426,5.118 6.536,5.118
  region: 7.806,6.008 8.696,6.008 8.696,5.118 7.806,5.118
  region: 9.076,6.008 9.966,6.008 9.966,5.118 9.076,5.118
  region: 10.346,6.008 11.236,6.008 11.236,5.118 10.346,5.118
  region: 11.616,6.008 12.506,6.008 12.506,5.118 11.616,5.118
  region: 11.616,-5.422 12.506,-5.422 12.506,-6.312 11.616,-6.312
Bottom Layer keep-out:
  circle w0.1: c7.061,10.16 r2.9
  circle w0.1: c-6.989,10.16 r2.9
  circle w0.1: c-6.989,-10.16 r2.9
  circle w0.1: c7.061,-10.16 r2.9
Top Overlay:
  drawing of 268 lines, arcs and shapes, not listed
  text "200" at -14.781,-6.085 h1
  text "1" at 13.185,5.106 h1
Mechanical 8:
  drawing of 1722 lines, arcs and shapes, not listed
Mechanical 14:
  drawing of 327 lines, arcs and shapes, not listed
  text "200" at -14.781,-6.085 h1
  text "1" at 13.185,5.106 h1
Mechanical 15:
  lines w0.05: -18.944,-2.155 -14.499,-2.155 -14.499,-7.235 14.499,-7.235 14.499,-5.965 18.944,-5.965 18.944,-1.655 14.499,-1.655 14.499,6.327 13.591,7.235 -14.499,7.235 -14.499,2.155 -18.944,2.155 -18.944,-2.155
3D body "SAMTEC_GFZ-20-01-G-10-AD_TOP.stp": height 2.92, standoff -1.27, extent -18.687,-6.985 18.687,6.985